# Altium footprint library 六角铜柱.PcbLib: 49 footprints (part 3 of 4)
Each footprint in its own frame and in the unit in brackets; x right, y up, seen from the top. Pads: shape width x height; smd on the part's side, far side on the other; paste and mask are expansions set on the pad; w line width, h text height; cw(c..) or ccw(c..) is an arc to the next point about the centre after c.
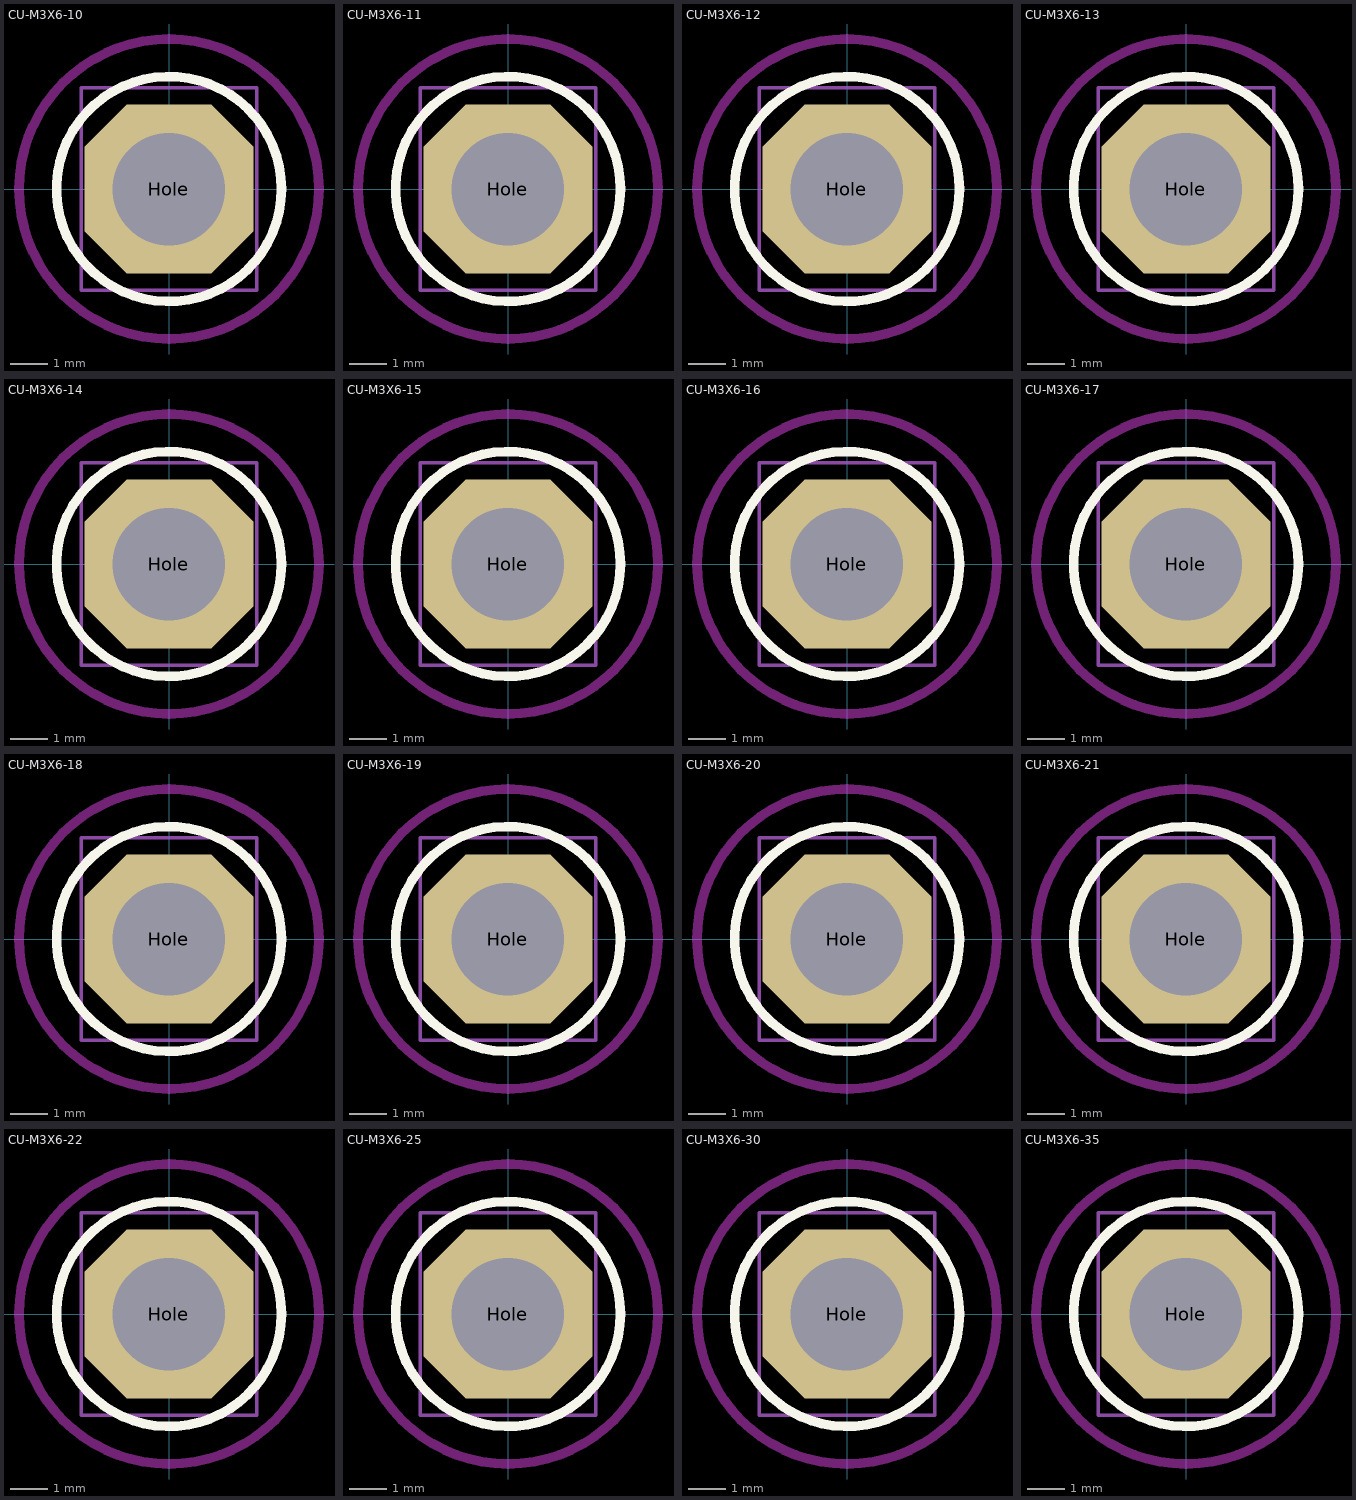
[diagram p2: the footprints below, top view; thin cyan lines are the x and y axes]

## CU-M3X6-10 [mm] "10mm长M3六角铜柱"
height 10
pads (1):
  oct 4.5x4.5 hole 3: Hole(0,0)
Top Overlay:
  circle w0.254: c0,0 r3
Keep-Out Layer:
  circle w0.254: c0,0 r4
Mechanical 1:
  circle w0.15: c0,0 r1.5
Mechanical 13:
  lines w0.1: -2.34,-2.702 -2.34,2.702 2.34,2.702 2.34,-2.702 -2.34,-2.702
Mechanical 15:
  lines w0.1: -1,0 1,0 ; 0,-1 0,1
3D body: height 10, standoff -6, extent -2.34,-2.702 2.34,2.702

## CU-M3X6-11 [mm] "11mm长M3六角铜柱"
height 11
pads (1):
  oct 4.5x4.5 hole 3: Hole(0,0)
Top Overlay:
  circle w0.254: c0,0 r3
Keep-Out Layer:
  circle w0.254: c0,0 r4
Mechanical 1:
  circle w0.15: c0,0 r1.5
Mechanical 13:
  lines w0.1: -2.34,-2.702 -2.34,2.702 2.34,2.702 2.34,-2.702 -2.34,-2.702
Mechanical 15:
  lines w0.1: -1,0 1,0 ; 0,-1 0,1
3D body: height 11, standoff -6, extent -2.34,-2.702 2.34,2.702

## CU-M3X6-12 [mm] "12mm长M3六角铜柱"
height 12
pads (1):
  oct 4.5x4.5 hole 3: Hole(0,0)
Top Overlay:
  circle w0.254: c0,0 r3
Keep-Out Layer:
  circle w0.254: c0,0 r4
Mechanical 1:
  circle w0.15: c0,0 r1.5
Mechanical 13:
  lines w0.1: -2.34,-2.702 -2.34,2.702 2.34,2.702 2.34,-2.702 -2.34,-2.702
Mechanical 15:
  lines w0.1: -1,0 1,0 ; 0,-1 0,1
3D body: height 12, standoff -6, extent -2.34,-2.702 2.34,2.702

## CU-M3X6-13 [mm] "13mm长M3六角铜柱"
height 13
pads (1):
  oct 4.5x4.5 hole 3: Hole(0,0)
Top Overlay:
  circle w0.254: c0,0 r3
Keep-Out Layer:
  circle w0.254: c0,0 r4
Mechanical 1:
  circle w0.15: c0,0 r1.5
Mechanical 13:
  lines w0.1: -2.34,-2.702 -2.34,2.702 2.34,2.702 2.34,-2.702 -2.34,-2.702
Mechanical 15:
  lines w0.1: -1,0 1,0 ; 0,-1 0,1
3D body: height 13, standoff -6, extent -2.34,-2.702 2.34,2.702

## CU-M3X6-14 [mm] "14mm长M3六角铜柱"
height 14
pads (1):
  oct 4.5x4.5 hole 3: Hole(0,0)
Top Overlay:
  circle w0.254: c0,0 r3
Keep-Out Layer:
  circle w0.254: c0,0 r4
Mechanical 1:
  circle w0.15: c0,0 r1.5
Mechanical 13:
  lines w0.1: -2.34,-2.702 2.34,-2.702 2.34,2.702 -2.34,2.702 -2.34,-2.702
Mechanical 15:
  lines w0.1: -1,0 1,0 ; 0,-1 0,1
3D body: height 14, standoff -6, extent -2.34,-2.702 2.34,2.702

## CU-M3X6-15 [mm] "15mm长M3六角铜柱"
height 15
pads (1):
  oct 4.5x4.5 hole 3: Hole(0,0)
Top Overlay:
  circle w0.254: c0,0 r3
Keep-Out Layer:
  circle w0.254: c0,0 r4
Mechanical 1:
  circle w0.15: c0,0 r1.5
Mechanical 13:
  lines w0.1: -2.34,-2.702 -2.34,2.702 2.34,2.702 2.34,-2.702 -2.34,-2.702
Mechanical 15:
  lines w0.1: -1,0 1,0 ; 0,-1 0,1
3D body: height 15, standoff -6, extent -2.34,-2.702 2.34,2.702

## CU-M3X6-16 [mm] "16mm长M3六角铜柱"
height 16
pads (1):
  oct 4.5x4.5 hole 3: Hole(0,0)
Top Overlay:
  circle w0.254: c0,0 r3
Keep-Out Layer:
  circle w0.254: c0,0 r4
Mechanical 1:
  circle w0.15: c0,0 r1.5
Mechanical 13:
  lines w0.1: -2.34,-2.702 2.34,-2.702 2.34,2.702 -2.34,2.702 -2.34,-2.702
Mechanical 15:
  lines w0.1: -1,0 1,0 ; 0,-1 0,1
3D body: height 16, standoff -6, extent -2.34,-2.702 2.34,2.702

## CU-M3X6-17 [mm] "17mm长M3六角铜柱"
height 17
pads (1):
  oct 4.5x4.5 hole 3: Hole(0,0)
Top Overlay:
  circle w0.254: c0,0 r3
Keep-Out Layer:
  circle w0.254: c0,0 r4
Mechanical 1:
  circle w0.15: c0,0 r1.5
Mechanical 13:
  lines w0.1: -2.34,-2.702 -2.34,2.702 2.34,2.702 2.34,-2.702 -2.34,-2.702
Mechanical 15:
  lines w0.1: -1,0 1,0 ; 0,-1 0,1
3D body: height 17, standoff -6, extent -2.34,-2.702 2.34,2.702

## CU-M3X6-18 [mm] "18mm长M3六角铜柱"
height 18
pads (1):
  oct 4.5x4.5 hole 3: Hole(0,0)
Top Overlay:
  circle w0.254: c0,0 r3
Keep-Out Layer:
  circle w0.254: c0,0 r4
Mechanical 1:
  circle w0.15: c0,0 r1.5
Mechanical 13:
  lines w0.1: -2.34,-2.702 -2.34,2.702 2.34,2.702 2.34,-2.702 -2.34,-2.702
Mechanical 15:
  lines w0.1: -1,0 1,0 ; 0,-1 0,1
3D body: height 18, standoff -6, extent -2.34,-2.702 2.34,2.702

## CU-M3X6-19 [mm] "19mm长M3六角铜柱"
height 19
pads (1):
  oct 4.5x4.5 hole 3: Hole(0,0)
Top Overlay:
  circle w0.254: c0,0 r3
Keep-Out Layer:
  circle w0.254: c0,0 r4
Mechanical 1:
  circle w0.15: c0,0 r1.5
Mechanical 13:
  lines w0.1: -2.34,-2.702 2.34,-2.702 2.34,2.702 -2.34,2.702 -2.34,-2.702
Mechanical 15:
  lines w0.1: -1,0 1,0 ; 0,-1 0,1
3D body: height 19, standoff -6, extent -2.34,-2.702 2.34,2.702

## CU-M3X6-20 [mm] "20mm长M3六角铜柱"
height 20
pads (1):
  oct 4.5x4.5 hole 3: Hole(0,0)
Top Overlay:
  circle w0.254: c0,0 r3
Keep-Out Layer:
  circle w0.254: c0,0 r4
Mechanical 1:
  circle w0.15: c0,0 r1.5
Mechanical 13:
  lines w0.1: -2.34,-2.702 -2.34,2.702 2.34,2.702 2.34,-2.702 -2.34,-2.702
Mechanical 15:
  lines w0.1: -1,0 1,0 ; 0,-1 0,1
3D body: height 20, standoff -6, extent -2.34,-2.702 2.34,2.702

## CU-M3X6-21 [mm] "21mm长M3六角铜柱"
height 21
pads (1):
  oct 4.5x4.5 hole 3: Hole(0,0)
Top Overlay:
  circle w0.254: c0,0 r3
Keep-Out Layer:
  circle w0.254: c0,0 r4
Mechanical 1:
  circle w0.15: c0,0 r1.5
Mechanical 13:
  lines w0.1: -2.34,-2.702 -2.34,2.702 2.34,2.702 2.34,-2.702 -2.34,-2.702
Mechanical 15:
  lines w0.1: -1,0 1,0 ; 0,-1 0,1
3D body: height 21, standoff -6, extent -2.34,-2.702 2.34,2.702

## CU-M3X6-22 [mm] "22mm长M3六角铜柱"
height 22
pads (1):
  oct 4.5x4.5 hole 3: Hole(0,0)
Top Overlay:
  circle w0.254: c0,0 r3
Keep-Out Layer:
  circle w0.254: c0,0 r4
Mechanical 1:
  circle w0.15: c0,0 r1.5
Mechanical 13:
  lines w0.1: -2.34,-2.702 -2.34,2.702 2.34,2.702 2.34,-2.702 -2.34,-2.702
Mechanical 15:
  lines w0.1: -1,0 1,0 ; 0,-1 0,1
3D body: height 22, standoff -6, extent -2.34,-2.702 2.34,2.702

## CU-M3X6-25 [mm] "25mm长M3六角铜柱"
height 25
pads (1):
  oct 4.5x4.5 hole 3: Hole(0,0)
Top Overlay:
  circle w0.254: c0,0 r3
Keep-Out Layer:
  circle w0.254: c0,0 r4
Mechanical 1:
  circle w0.15: c0,0 r1.5
Mechanical 13:
  lines w0.1: -2.34,-2.702 -2.34,2.702 2.34,2.702 2.34,-2.702 -2.34,-2.702
Mechanical 15:
  lines w0.1: -1,0 1,0 ; 0,-1 0,1
3D body: height 25, standoff -6, extent -2.34,-2.702 2.34,2.702

## CU-M3X6-30 [mm] "30mm长M3六角铜柱"
height 30
pads (1):
  oct 4.5x4.5 hole 3: Hole(0,0)
Top Overlay:
  circle w0.254: c0,0 r3
Keep-Out Layer:
  circle w0.254: c0,0 r4
Mechanical 1:
  circle w0.15: c0,0 r1.5
Mechanical 13:
  lines w0.1: -2.34,-2.702 -2.34,2.702 2.34,2.702 2.34,-2.702 -2.34,-2.702
Mechanical 15:
  lines w0.1: -1,0 1,0 ; 0,-1 0,1
3D body: height 30, standoff -6, extent -2.34,-2.702 2.34,2.702

## CU-M3X6-35 [mm] "35mm长M3六角铜柱"
height 35
pads (1):
  oct 4.5x4.5 hole 3: Hole(0,0)
Top Overlay:
  circle w0.254: c0,0 r3
Keep-Out Layer:
  circle w0.254: c0,0 r4
Mechanical 1:
  circle w0.15: c0,0 r1.5
Mechanical 13:
  lines w0.1: -2.34,-2.702 -2.34,2.702 2.34,2.702 2.34,-2.702 -2.34,-2.702
Mechanical 15:
  lines w0.1: -1,0 1,0 ; 0,-1 0,1
3D body: height 35, standoff -6, extent -2.34,-2.702 2.34,2.702